# Altium footprint library MyPcbLib.PcbLib: 80 footprints (part 1 of 5)
Each footprint in its own frame and in the unit in brackets; x right, y up, seen from the top. Pads: shape width x height; smd on the part's side, far side on the other; paste and mask are expansions set on the pad; w line width, h text height; cw(c..) or ccw(c..) is an arc to the next point about the centre after c.
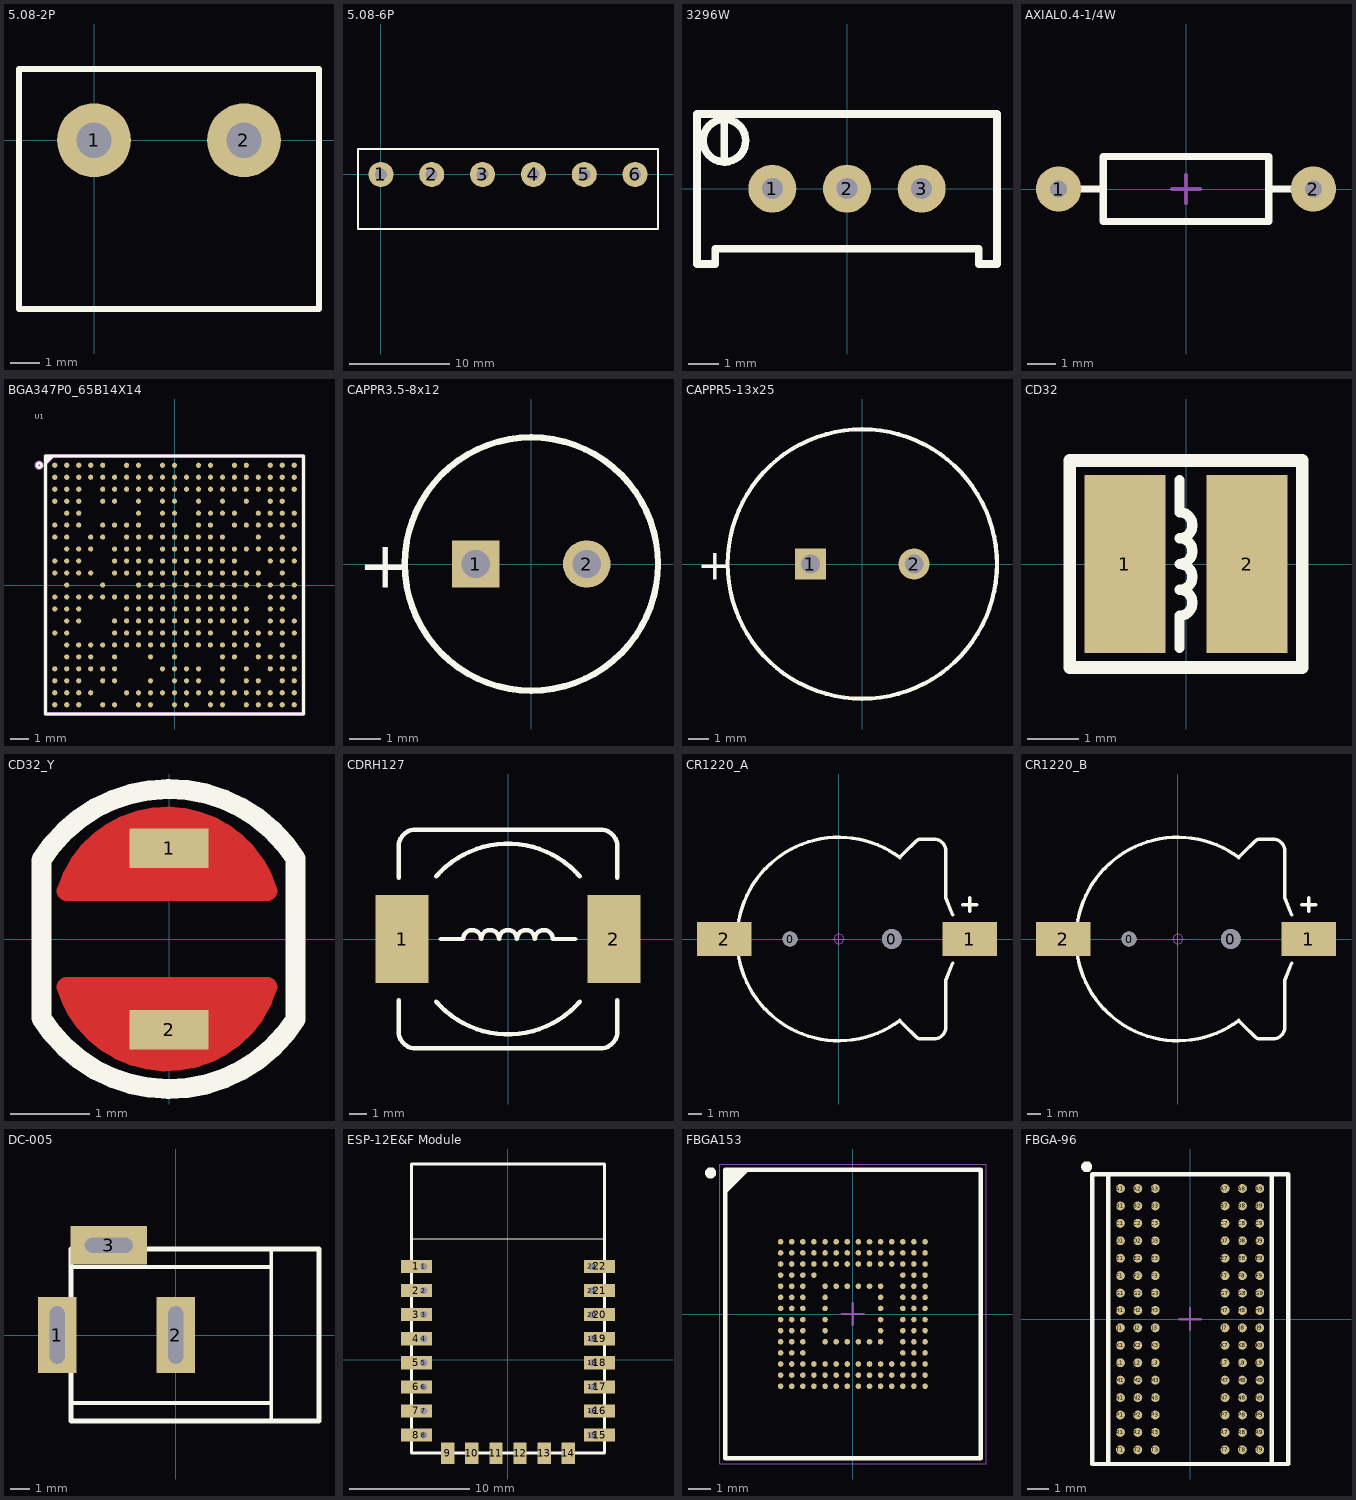
[diagram p0: the footprints below, top view; thin cyan lines are the x and y axes]

## 5.08-2P [mm]
pads (2):
  round 2.5 hole 1.2: 1(0,0) 2(5.08,0)
Top Overlay:
  lines w0.2: -2.54,-5.715 7.62,-5.715 7.62,2.413 -2.54,2.413 -2.54,-5.715
3D body "050-2.STEP": height 11, standoff -2, extent -2.46,-5.587 7.54,2.413

## 5.08-6P [mm]
pads (6):
  round 2.5 hole 1.2: 1(0,0) 2(5.08,0) 3(10.16,0) 4(15.24,0) 5(20.32,0) 6(25.4,0)
Top Overlay:
  lines w0.2: -2.286,-5.461 27.686,-5.461 27.686,2.54 -2.286,2.54 -2.286,-5.461
3D body "050-6.STEP": height 11, standoff -2, extent -2.3,-5.46 27.7,2.54

## 3296W [mm]
pads (3):
  round 1.6 hole 0.7: 1(-2.489,0) 2(0,0) 3(2.489,0)
Top Overlay:
  circle w0.254: c-4.089,1.6 r0.711
  lines w0.254: -4.089,0.889 -4.089,2.286 ; -5.004,-2.515 -5.004,2.489 5.004,2.489 5.004,-2.515 4.394,-2.515 4.394,-2.007 -4.394,-2.007 -4.394,-2.515 -5.004,-2.515
3D body "3296W.STEP": height 11.55, standoff -6.4, extent -4.765,-2.418 4.765,2.413

## AXIAL0.4-1/4W [mm] "脚距9mm，直径2.3mm"
pads (2):
  round 1.6 hole 0.6: 1(-4.5,0) 2(4.5,0)
Top Overlay:
  lines w0.254: -3.683,0 -3.048,0 ; 3.048,0 3.683,0 ; -2.921,-1.143 -2.921,1.143 2.921,1.143 2.921,-1.143 -2.921,-1.143
Mechanical 15:
  lines w0.127: -0.508,0 0.508,0 ; 0,-0.508 0,0.508
3D body "RS 1-4W.STEP": height 2.32, standoff -3.49, extent -4.725,-1.16 4.725,1.16

## BGA347P0_65B14X14 [mil]
pads (347):
  round 11 smd: A1(-255.93,255.96) A2(-230.33,255.96) A3(-204.73,255.95) A4(-179.12,255.96) A5(-153.53,255.96) A7(-102.43,255.96) A8(-76.83,255.95) A10(-25.63,255.96) A11(-0.03,255.96) A13(51.17,255.95) A14(76.77,255.95) A16(127.97,255.96) A17(153.47,255.96) A19(204.67,255.95) A20(230.28,255.96) A21(255.87,255.96) AA1(-255.93,-255.85) AA2(-230.33,-255.85) AA3(-204.73,-255.84) AA5(-153.53,-255.85) AA6(-128.03,-255.85) AA8(-76.83,-255.84) AA9(-51.23,-255.84) AA11(-0.03,-255.85) AA12(25.57,-255.85) AA14(76.77,-255.84) AA15(102.37,-255.85) AA17(153.47,-255.85) AA18(179.07,-255.85) AA19(204.67,-255.84) AA20(230.28,-255.85) AA21(255.87,-255.85) B1(-255.93,230.36) B2(-230.33,230.35) B3(-204.73,230.35) B4(-179.13,230.35) B5(-153.53,230.36) B6(-128.03,230.36) B7(-102.42,230.35) B8(-76.83,230.35) B9(-51.23,230.35) B10(-25.63,230.35) B11(-0.03,230.36) B12(25.58,230.35) B13(51.17,230.35) B14(76.77,230.35) B15(102.37,230.35) B16(127.97,230.36) B17(153.47,230.36) B18(179.07,230.35) B19(204.67,230.35) B20(230.27,230.35) B21(255.87,230.36) C1(-255.92,204.76) C2(-230.33,204.76) C3(-204.73,204.76) C5(-153.53,204.76) C6(-128.02,204.76) C7(-102.42,204.76) C8(-76.83,204.76) C9(-51.23,204.76) C10(-25.63,204.76) C11(-0.03,204.75) C12(25.58,204.76) C13(51.17,204.76) C14(76.77,204.76) C15(102.37,204.76) C16(127.97,204.76) C17(153.48,204.76) C18(179.07,204.76) C19(204.67,204.76) C20(230.27,204.76) C21(255.87,204.76) D1(-255.93,179.15) D2(-230.33,179.16) D3(-204.73,179.16) D5(-153.53,179.15) D6(-128.03,179.15) D8(-76.83,179.16) D10(-25.63,179.15) D11(-0.03,179.15) D13(51.17,179.16) D15(102.37,179.16) D17(153.47,179.15) D19(204.67,179.16) D20(230.27,179.16) E2(-230.33,153.56) E3(-204.73,153.56) E8(-76.83,153.56) E10(-25.63,153.56) E11(-0.03,153.56) E13(51.17,153.56) E14(76.77,153.56) E15(102.37,153.56) E16(127.97,153.56) E18(179.07,153.56) E19(204.67,153.56) E20(230.28,153.56) E21(255.87,153.56) F1(-255.93,128.06) F2(-230.33,128.06) F3(-204.73,128.05) F5(-153.53,128.06) F6(-128.03,128.06) F7(-102.43,128.06) F8(-76.83,128.06) F10(-25.63,128.06) F11(-0.03,128.06) F13(51.17,128.06) F14(76.78,128.06) F16(127.97,128.06) F17(153.47,128.06) F18(179.07,128.06) F19(204.67,128.05) F20(230.28,128.06) F21(255.87,128.06) G1(-255.93,102.46) G2(-230.33,102.45) G4(-179.13,102.45) G5(-153.53,102.46) G7(-102.43,102.46) G8(-76.83,102.45) G9(-51.23,102.45) G10(-25.63,102.46) G11(-0.03,102.46) G12(25.57,102.46) G13(51.17,102.45) G14(76.77,102.45) G15(102.37,102.46) G18(179.07,102.45) G20(230.27,102.45) H2(-230.33,76.86) H3(-204.73,76.86) H4(-179.13,76.86) H6(-128.03,76.86) H7(-102.42,76.86) H8(-76.83,76.86) H10(-25.63,76.86) H11(-0.03,76.86) H12(25.58,76.86) H13(51.17,76.86) H14(76.77,76.86) H15(102.37,76.86) H16(127.97,76.86) H17(153.48,76.86) H18(179.07,76.86) H19(204.67,76.86) H20(230.27,76.86) H21(255.87,76.86) J1(-255.92,51.26) J2(-230.33,51.26) J3(-204.73,51.26) J6(-128.03,51.25) J7(-102.42,51.26) J8(-76.83,51.26) J9(-51.23,51.26) J10(-25.63,51.26) J11(-0.03,51.25) J12(25.58,51.26) J13(51.17,51.26) J14(76.77,51.26) J15(102.37,51.26) J16(127.97,51.25) J19(204.67,51.26) J20(230.27,51.26) J21(255.87,51.26) K1(-255.93,25.65) K2(-230.33,25.66) K3(-204.73,25.66) K4(-179.12,25.65) K6(-128.03,25.65) K7(-102.43,25.65) K8(-76.83,25.66) K9(-51.23,25.66) K10(-25.63,25.65) K11(-0.03,25.65) K12(25.57,25.65) K13(51.17,25.66) K14(76.77,25.66) K15(102.37,25.65) K16(127.97,25.65) K17(153.47,25.65) K18(179.07,25.65) K20(230.27,25.66) L2(-230.33,0.06) L5(-153.53,0.06) L8(-76.83,0.06) L9(-51.22,0.06) L10(-25.63,0.06) L11(-0.03,0.06) L12(25.57,0.06) L13(51.17,0.06) L14(76.78,0.06) L15(102.37,0.06) L16(127.97,0.06) L17(153.47,0.06) L18(179.07,0.06) L19(204.67,0.06) L20(230.28,0.06) L21(255.87,0.06) M1(-255.93,-25.54) M2(-230.33,-25.55) M3(-204.73,-25.55) M4(-179.12,-25.54) M5(-153.53,-25.54) M6(-128.03,-25.54) M7(-102.43,-25.54) M8(-76.83,-25.55) M9(-51.23,-25.55) M10(-25.63,-25.54) M11(-0.03,-25.54) M12(25.57,-25.54) M13(51.17,-25.55) M14(76.77,-25.55) M15(102.37,-25.54) M16(127.97,-25.54) M19(204.67,-25.55) M20(230.27,-25.55) M21(255.87,-25.54) N1(-255.92,-51.15) N2(-230.33,-51.15) N3(-204.73,-51.15) N7(-102.42,-51.15) N8(-76.83,-51.15) N9(-51.23,-51.15) N10(-25.63,-51.15) N11(-0.03,-51.14) N12(25.58,-51.15) N13(51.17,-51.15) N14(76.77,-51.15) N15(102.37,-51.15) N16(127.97,-51.14) N17(153.47,-51.14) N19(204.67,-51.15) N20(230.27,-51.15) P2(-230.33,-76.74) P3(-204.73,-76.74) P6(-128.03,-76.75) P7(-102.42,-76.74) P8(-76.83,-76.74) P9(-51.23,-76.74) P10(-25.63,-76.74) P11(-0.03,-76.75) P12(25.58,-76.74) P13(51.17,-76.74) P14(76.77,-76.74) P15(102.37,-76.74) P16(127.97,-76.75) P17(153.48,-76.74) P19(204.67,-76.74) P20(230.27,-76.74) P21(255.87,-76.74) R1(-255.93,-102.35) R2(-230.33,-102.34) R6(-128.03,-102.35) R7(-102.43,-102.35) R8(-76.83,-102.34) R9(-51.23,-102.34) R10(-25.63,-102.35) R11(-0.03,-102.35) R12(25.57,-102.35) R13(51.17,-102.34) R14(76.77,-102.34) R16(127.97,-102.35) R17(153.47,-102.35) R18(179.07,-102.34) R19(204.67,-102.34) R20(230.27,-102.34) R21(255.87,-102.35) T2(-230.33,-127.94) T3(-204.73,-127.94) T4(-179.12,-127.94) T5(-153.53,-127.94) T6(-128.03,-127.94) T7(-102.43,-127.94) T8(-76.83,-127.94) T9(-51.22,-127.94) T10(-25.63,-127.94) T11(-0.03,-127.94) T12(25.57,-127.94) T13(51.17,-127.94) T14(76.78,-127.94) T15(102.37,-127.94) T16(127.97,-127.94) T17(153.47,-127.94) T18(179.07,-127.94) T20(230.28,-127.94) U2(-230.33,-153.44) U3(-204.73,-153.45) U4(-179.12,-153.44) U6(-128.03,-153.44) U9(-51.22,-153.44) U11(-0.03,-153.44) U15(102.37,-153.44) U16(127.97,-153.44) U18(179.07,-153.44) U19(204.67,-153.45) U20(230.28,-153.44) U21(255.87,-153.44) V1(-255.93,-179.04) V2(-230.33,-179.05) V3(-204.73,-179.05) V4(-179.13,-179.05) V5(-153.53,-179.04) V6(-128.03,-179.04) V10(-25.63,-179.04) V11(-0.03,-179.04) V12(25.57,-179.04) V13(51.17,-179.05) V15(102.37,-179.05) V17(153.47,-179.04) V19(204.67,-179.05) V20(230.27,-179.05) V21(255.87,-179.04) W1(-255.92,-204.64) W2(-230.33,-204.64) W3(-204.73,-204.64) W5(-153.53,-204.64) W6(-128.02,-204.64) W9(-51.23,-204.64) W11(-0.03,-204.64) W12(25.58,-204.64) W13(51.17,-204.64) W15(102.37,-204.64) W17(153.48,-204.64) W18(179.07,-204.64) W20(230.27,-204.64) W21(255.87,-204.64) Y1(-255.93,-230.25) Y2(-230.33,-230.24) Y3(-204.73,-230.24) Y4(-179.13,-230.24) Y7(-102.42,-230.24) Y8(-76.83,-230.24) Y9(-51.23,-230.24) Y10(-25.63,-230.24) Y11(-0.03,-230.25) Y12(25.58,-230.24) Y13(51.17,-230.24) Y14(76.77,-230.24) Y15(102.37,-230.24) Y16(127.97,-230.25) Y17(153.47,-230.25) Y18(179.07,-230.24) Y19(204.67,-230.24) Y20(230.27,-230.24) Y21(255.87,-230.25)
Top Overlay:
  circle w6: c-289.37,255.94 r4.93
  lines w6: -275.66,259.85 -259.82,275.69 ; -275.66,267.77 -267.74,275.69 ; -275.66,-275.57 275.6,-275.57 275.53,275.62 -275.66,275.69 -275.66,-275.57
  text "U1" at -299.2,355.5 h10
Mechanical 112:
  circle w9.8: c-289.37,255.94 r4.93
  lines w7.9: -275.66,259.85 -259.82,275.69 ; -275.66,267.77 -267.74,275.69 ; -275.66,-275.57 275.6,-275.57 275.53,275.62 -275.66,275.69 -275.66,-275.57
Mechanical 113:
  lines w7.9: -275.66,259.85 -259.82,275.69 ; -275.66,267.77 -267.74,275.69 ; -275.66,-275.57 275.6,-275.57 275.53,275.62 -275.66,275.69 -275.66,-275.57
3D body: height 47.24, standoff 0, extent -275.66,-275 275,275.69

## CAPPR3.5-8x12 [mm] "Capacitor, Electrolytic, Radial; Body 8 x 12 mm (Dia.xH typ); Pin Spacing 3.5 mm (typ)"
height 13.5
pads (2):
  rect 1.5x1.5 hole 0.9: 1(-1.75,0)
  round 1.5 hole 0.9: 2(1.75,0)
Top Overlay:
  circle w0.2: c0,0 r4
  text "+" at -5.475,-0.75 h1.5
3D body "CAP PR3.5x8x11.5mm.STEP": height 12.03, standoff -3.48, extent -4.026,-4.025 4.025,4.026

## CAPPR5-13x25 [mm] "Capacitor, Electrolytic, Radial; Body 13 x 25 mm (Dia.xH typ); Pin Spacing 5 mm (typ)"
height 27
pads (2):
  rect 1.5x1.5 hole 0.9: 1(-2.5,0)
  round 1.5 hole 0.9: 2(2.5,0)
Top Overlay:
  circle w0.2: c0,0 r6.5
  text "+" at -7.975,-0.75 h1.5
3D body "EC051321 2200uF, 25V BLK.step": height 25.4, standoff -28.75, extent -6.6,-6.6 6.6,6.6

## CD32 [mm] "3.5*3*2mm（长宽高）"
pads (2):
  rect 1.6x3.5 smd: 1(-1.2,0) 2(1.2,0)
Top Overlay:
  lines w0.203: -0.127,-1.651 -0.127,-1.016 ccw(c-0.127,-0.762) -0.127,-0.508 ccw(c-0.127,-0.254) -0.127,0 ccw(c-0.127,0.254) -0.127,0.508 ccw(c-0.127,0.762) -0.127,1.016 -0.127,1.651
  lines w0.254: -2.286,-2.032 2.286,-2.032 2.286,2.032 -2.286,2.032 -2.286,-2.032
3D body "CD32.STEP": height 2.15, standoff 0.05, extent -1.707,-1.5 1.707,1.5

## CD32_Y [mm]
pads (2):
  rect 1x0.5 smd: 1(0,1.15) 2(0,-1.15)
Top Layer:
  region: -1.295,0.61 -1.254,0.745 -1.116,0.992 -0.929,1.205 -0.702,1.373 -0.444,1.49 -0.167,1.55 0.116,1.55 0.393,1.49 0.651,1.373 0.878,1.205 1.065,0.992 1.203,0.745 1.245,0.61
  region: -1.295,-0.61 -1.254,-0.745 -1.116,-0.992 -0.929,-1.205 -0.702,-1.373 -0.444,-1.49 -0.167,-1.55 0.116,-1.55 0.393,-1.49 0.651,-1.373 0.878,-1.205 1.065,-0.992 1.203,-0.745 1.245,-0.61
  lines w0.254: -1.295,-0.61 ccw(c-0.025,-0.222) -1.177,-0.883 ccw(c-0.025,-0.222) 1.245,-0.61 -0.356,-0.61 -1.295,-0.61 ; -1.295,0.61 cw(c-0.025,0.222) 0,1.549 cw(c-0.025,0.222) 1.245,0.61 -1.295,0.61
Top Overlay:
  lines w0.254: -1.616,-1 ccw(c0,0) 1.605,-1.017 1.605,1.017 ccw(c0,0) -1.616,1 -1.616,-1
3D body "User Library-CD32 inductor.STEP": height 2.1, standoff 0, extent -1.5,-1.651 1.5,1.651

## CDRH127 [mm] "12*12*8mm（长宽高）"
pads (2):
  rect 3x5 smd: 1(-6,0) 2(6,0)
Top Overlay:
  lines w0.254: -6.2,-3.475 -6.2,-5.23 ccw(c-5.23,-5.23) -5.23,-6.2 5.23,-6.2 ccw(c5.23,-5.23) 6.2,-5.23 6.2,-3.475 ; -6.2,3.475 -6.2,5.23 cw(c-5.23,5.23) -5.23,6.2 5.23,6.2 cw(c5.23,5.23) 6.2,5.23 6.2,3.475 ; -4.064,-3.556 ccw(c0,0) 4.064,-3.556 ; -4.064,3.556 cw(c0,0) 4.064,3.556 ; -3.81,0 -2.54,0 cw(c-2.032,0) -1.524,0 cw(c-1.016,0) -0.508,0 cw(c0,0) 0.508,0 cw(c1.016,0) 1.524,0 cw(c2.032,0) 2.54,0 3.81,0
3D body "CDRH127.STEP": height 7.8, standoff 0, extent -6,-6 6,6

## CR1220_A [mm] "纽扣电池座"
pads (4):
  round 1.1 hole 1.1: 0(-3.6,0)
  round 1.45 hole 1.45: 0(3.9,0)
  rect 4x2.5 smd: 1(9.652,0) 2(-8.458,0)
Top Overlay:
  lines w0.254: 4.5,-6 cw(c0,0) 4.5,6 ; 4.572,-6.096 4.826,-6.35 5.662,-7.186 ccw(c6.096,-6.753) 6.096,-7.366 7.007,-7.366 ccw(c7.007,-6.499) 7.874,-6.499 7.874,-3.048 8.382,-1.778 ; 4.572,6.096 4.826,6.35 5.662,7.186 cw(c6.096,6.753) 6.096,7.366 7.007,7.366 cw(c7.007,6.499) 7.874,6.499 7.874,3.048 8.382,1.778 ; 9.144,2.54 10.16,2.54 ; 9.652,2.032 9.652,3.048
Mechanical 15:
  circle w0.05: c0,0 r0.35
  lines w0.05: -0.5,0 0.5,0 ; 0,-0.5 0,0.5
3D body "CR1220_A.STEP": height 4.05, standoff -0.85, extent -9.416,-7.45 10.34,7.45

## CR1220_B [mm] "纽扣电池座"
pads (4):
  round 1.1 hole 1.1: 0(-3.6,0)
  round 1.45 hole 1.45: 0(3.9,0)
  rect 4x2.5 smd: 1(9.652,0) 2(-8.458,0)
Top Overlay:
  lines w0.254: 4.5,-6 cw(c0,0) 4.5,6 ; 4.572,-6.096 4.826,-6.35 5.662,-7.186 ccw(c6.096,-6.753) 6.096,-7.366 7.007,-7.366 ccw(c7.007,-6.499) 7.874,-6.499 7.874,-3.048 8.382,-1.778 ; 4.572,6.096 4.826,6.35 5.662,7.186 cw(c6.096,6.753) 6.096,7.366 7.007,7.366 cw(c7.007,6.499) 7.874,6.499 7.874,3.048 8.382,1.778 ; 9.144,2.54 10.16,2.54 ; 9.652,2.032 9.652,3.048
Mechanical 15:
  circle w0.05: c0,0 r0.35
  lines w0.05: -0.5,0 0.5,0 ; 0,-0.5 0,0.5
3D body "CR1220_B.STEP": height 4.05, standoff -0.85, extent -9.416,-7.45 10.34,7.45

## DC-005 [mm] "5.5*2.1mm，DC30V,2.5A"
pads (3):
  rect 2x4 hole 0.8 slot 3 at 90 deg: 1(-6.2,0) 2(0,0)
  rect 4x2 hole 0.8 slot 2.5 at 0 deg: 3(-3.5,4.7)
Top Overlay:
  lines w0.2: -5.484,-3.556 5,-3.556 ; -5.484,3.556 5,3.556 ; 5,-4.5 5,4.5
  lines w0.254: -5.484,-4.5 -5.484,4.5 7.5,4.5 7.5,-4.5 -5.484,-4.5
3D body "dc-005.STEP": height 11.2, standoff -3.8, extent -6.55,-4.5 7.5,4.8

## ESP-12E&F Module [mm]
pads (38):
  rect 2.6x1.1 smd: 1(-7.6,7.75) 2(-7.6,5.75) 3(-7.6,3.75) 4(-7.6,1.75) 5(-7.6,-0.25) 6(-7.6,-2.25) 7(-7.6,-4.25) 8(-7.6,-6.25) 15(7.6,-6.25) 16(7.6,-4.25) 17(7.6,-2.25) 18(7.6,-0.25) 19(7.6,1.75) 20(7.6,3.75) 21(7.6,5.75) 22(7.6,7.75)
  rect 0.762x1 hole 0.6: 1(-7,7.75) 7(-7,-4.25)
  rect 0.762x1 / inner rect 0.762x1 / far side rect 1x1 hole 0.6: 2(-7,5.75) 3(-7,3.75) 4(-7,1.75) 5(-7,-0.25) 6(-7,-2.25) 8(-7,-6.25) 15(7,-6.25) 16(7,-4.25) 17(7,-2.25) 18(7,-0.25) 19(7,1.75) 20(7,3.75) 21(7,5.75) 22(7,7.75)
  rect 1.1x1.8 smd: 9(-5,-7.75) 10(-3,-7.75) 11(-1,-7.75) 12(1,-7.75) 13(3,-7.75) 14(5,-7.75)
Top Overlay:
  lines w0.1: -8,10.05 8,10.05
  lines w0.254: -8,-7.75 -8,16.25 8,16.25 8,-7.75 -8,-7.75

## FBGA153 [mm]
pads (153):
  round 0.25 smd: A1(-3.25,3.25) A2(-2.75,3.25) A3(-2.25,3.25) A4(-1.75,3.25) A5(-1.25,3.25) A6(-0.75,3.25) A7(-0.25,3.25) A8(0.25,3.25) A9(0.75,3.25) A10(1.25,3.25) A11(1.75,3.25) A12(2.25,3.25) A13(2.75,3.25) A14(3.25,3.25) B1(-3.25,2.75) B2(-2.75,2.75) B3(-2.25,2.75) B4(-1.75,2.75) B5(-1.25,2.75) B6(-0.75,2.75) B7(-0.25,2.75) B8(0.25,2.75) B9(0.75,2.75) B10(1.25,2.75) B11(1.75,2.75) B12(2.25,2.75) B13(2.75,2.75) B14(3.25,2.75) C1(-3.25,2.25) C2(-2.75,2.25) C3(-2.25,2.25) C4(-1.75,2.25) C5(-1.25,2.25) C6(-0.75,2.25) C7(-0.25,2.25) C8(0.25,2.25) C9(0.75,2.25) C10(1.25,2.25) C11(1.75,2.25) C12(2.25,2.25) C13(2.75,2.25) C14(3.25,2.25) D1(-3.25,1.75) D2(-2.75,1.75) D3(-2.25,1.75) D4(-1.75,1.75) D12(2.25,1.75) D13(2.75,1.75) D14(3.25,1.75) E1(-3.25,1.25) E2(-2.75,1.25) E3(-2.25,1.25) E5(-1.25,1.25) E6(-0.75,1.25) E7(-0.25,1.25) E8(0.25,1.25) E9(0.75,1.25) E10(1.25,1.25) E12(2.25,1.25) E13(2.75,1.25) E14(3.25,1.25) F1(-3.25,0.75) F2(-2.75,0.75) F3(-2.25,0.75) F5(-1.25,0.75) F10(1.25,0.75) F12(2.25,0.75) F13(2.75,0.75) F14(3.25,0.75) G1(-3.25,0.25) G2(-2.75,0.25) G3(-2.25,0.25) G5(-1.25,0.25) G10(1.25,0.25) G12(2.25,0.25) G13(2.75,0.25) G14(3.25,0.25) H1(-3.25,-0.25) H2(-2.75,-0.25) H3(-2.25,-0.25) H5(-1.25,-0.25) H10(1.25,-0.25) H12(2.25,-0.25) H13(2.75,-0.25) H14(3.25,-0.25) J1(-3.25,-0.75) J2(-2.75,-0.75) J3(-2.25,-0.75) J5(-1.25,-0.75) J10(1.25,-0.75) J12(2.25,-0.75) J13(2.75,-0.75) J14(3.25,-0.75) K1(-3.25,-1.25) K2(-2.75,-1.25) K3(-2.25,-1.25) K5(-1.25,-1.25) K6(-0.75,-1.25) K7(-0.25,-1.25) K8(0.25,-1.25) K9(0.75,-1.25) K10(1.25,-1.25) K12(2.25,-1.25) K13(2.75,-1.25) K14(3.25,-1.25) L1(-3.25,-1.75) L2(-2.75,-1.75) L3(-2.25,-1.75) L12(2.25,-1.75) L13(2.75,-1.75) L14(3.25,-1.75) M1(-3.25,-2.25) M2(-2.75,-2.25) M3(-2.25,-2.25) M4(-1.75,-2.25) M5(-1.25,-2.25) M6(-0.75,-2.25) M7(-0.25,-2.25) M8(0.25,-2.25) M9(0.75,-2.25) M10(1.25,-2.25) M11(1.75,-2.25) M12(2.25,-2.25) M13(2.75,-2.25) M14(3.25,-2.25) N1(-3.25,-2.75) N2(-2.75,-2.75) N3(-2.25,-2.75) N4(-1.75,-2.75) N5(-1.25,-2.75) N6(-0.75,-2.75) N7(-0.25,-2.75) N8(0.25,-2.75) N9(0.75,-2.75) N10(1.25,-2.75) N11(1.75,-2.75) N12(2.25,-2.75) N13(2.75,-2.75) N14(3.25,-2.75) P1(-3.25,-3.25) P2(-2.75,-3.25) P3(-2.25,-3.25) P4(-1.75,-3.25) P5(-1.25,-3.25) P6(-0.75,-3.25) P7(-0.25,-3.25) P8(0.25,-3.25) P9(0.75,-3.25) P10(1.25,-3.25) P11(1.75,-3.25) P12(2.25,-3.25) P13(2.75,-3.25) P14(3.25,-3.25)
Top Overlay:
  circle w0.25: c-6.4,6.35 r0.125
  region: -4.75,6.5 -5.75,5.5 -5.75,6.5
  lines w0.2: -5.75,5.5 -4.75,6.5 ; -5.75,-6.5 -5.75,6.5 5.75,6.5 5.75,-6.5 -5.75,-6.5
Mechanical 13:
  lines w0.1: -5.75,-6.5 -5.75,6.5 5.75,6.5 5.75,-6.5 -5.75,-6.5
Mechanical 15:
  lines w0.05: -6,-6.75 -6,6.75 6,6.75 6,-6.75 -6,-6.75
  lines w0.1: -0.5,0 0.5,0 ; 0,-0.5 0,0.5
3D body "User Library-153BallWFBGA.STEP": height 0.63, standoff -0.17, extent -5.75,-6.5 5.75,6.5

## FBGA-96 [mm]
pads (96):
  round 0.41 smd: A1(-3.2,6) A2(-2.4,6) A3(-1.6,6) A7(1.6,6) A8(2.4,6) A9(3.2,6) B1(-3.2,5.2) B2(-2.4,5.2) B3(-1.6,5.2) B7(1.6,5.2) B8(2.4,5.2) B9(3.2,5.2) C1(-3.2,4.4) C2(-2.4,4.4) C3(-1.6,4.4) C7(1.6,4.4) C8(2.4,4.4) C9(3.2,4.4) D1(-3.2,3.6) D2(-2.4,3.6) D3(-1.6,3.6) D7(1.6,3.6) D8(2.4,3.6) D9(3.2,3.6) E1(-3.2,2.8) E2(-2.4,2.8) E3(-1.6,2.8) E7(1.6,2.8) E8(2.4,2.8) E9(3.2,2.8) F1(-3.2,2) F2(-2.4,2) F3(-1.6,2) F7(1.6,2) F8(2.4,2) F9(3.2,2) G1(-3.2,1.2) G2(-2.4,1.2) G3(-1.6,1.2) G7(1.6,1.2) G8(2.4,1.2) G9(3.2,1.2) H1(-3.2,0.4) H2(-2.4,0.4) H3(-1.6,0.4) H7(1.6,0.4) H8(2.4,0.4) H9(3.2,0.4) J1(-3.2,-0.4) J2(-2.4,-0.4) J3(-1.6,-0.4) J7(1.6,-0.4) J8(2.4,-0.4) J9(3.2,-0.4) K1(-3.2,-1.2) K2(-2.4,-1.2) K3(-1.6,-1.2) K7(1.6,-1.2) K8(2.4,-1.2) K9(3.2,-1.2) L1(-3.2,-2) L2(-2.4,-2) L3(-1.6,-2) L7(1.6,-2) L8(2.4,-2) L9(3.2,-2) M1(-3.2,-2.8) M2(-2.4,-2.8) M3(-1.6,-2.8) M7(1.6,-2.8) M8(2.4,-2.8) M9(3.2,-2.8) N1(-3.2,-3.6) N2(-2.4,-3.6) N3(-1.6,-3.6) N7(1.6,-3.6) N8(2.4,-3.6) N9(3.2,-3.6) P1(-3.2,-4.4) P2(-2.4,-4.4) P3(-1.6,-4.4) P7(1.6,-4.4) P8(2.4,-4.4) P9(3.2,-4.4) R1(-3.2,-5.2) R2(-2.4,-5.2) R3(-1.6,-5.2) R7(1.6,-5.2) R8(2.4,-5.2) R9(3.2,-5.2) T1(-3.2,-6) T2(-2.4,-6) T3(-1.6,-6) T7(1.6,-6) T8(2.4,-6) T9(3.2,-6)
Top Overlay:
  circle w0.25: c-4.75,7 r0.125
  lines w0.2: -3.75,-6.65 3.75,-6.65 ; -3.75,-6.65 -3.75,6.65 ; -3.75,-6.65 -4.5,-6.65 -4.5,6.65 -3.75,6.65 ; -3.75,6.65 3.75,6.65 ; 3.75,-6.65 3.75,6.65 ; 3.75,-6.65 4.5,-6.65 4.5,6.65 3.75,6.65
Mechanical 15:
  lines w0.1: -0.5,0 0.5,0 ; 0,-0.5 0,0.5
3D body: height 1, standoff 0, extent -3.75,-6.65 3.75,6.65